# Altium footprint library PCB_IntegratedCircuit.PcbLib: 82 footprints (part 2 of 6)
Each footprint in its own frame and in the unit in brackets; x right, y up, seen from the top. Pads: shape width x height; smd on the part's side, far side on the other; paste and mask are expansions set on the pad; w line width, h text height; cw(c..) or ccw(c..) is an arc to the next point about the centre after c.
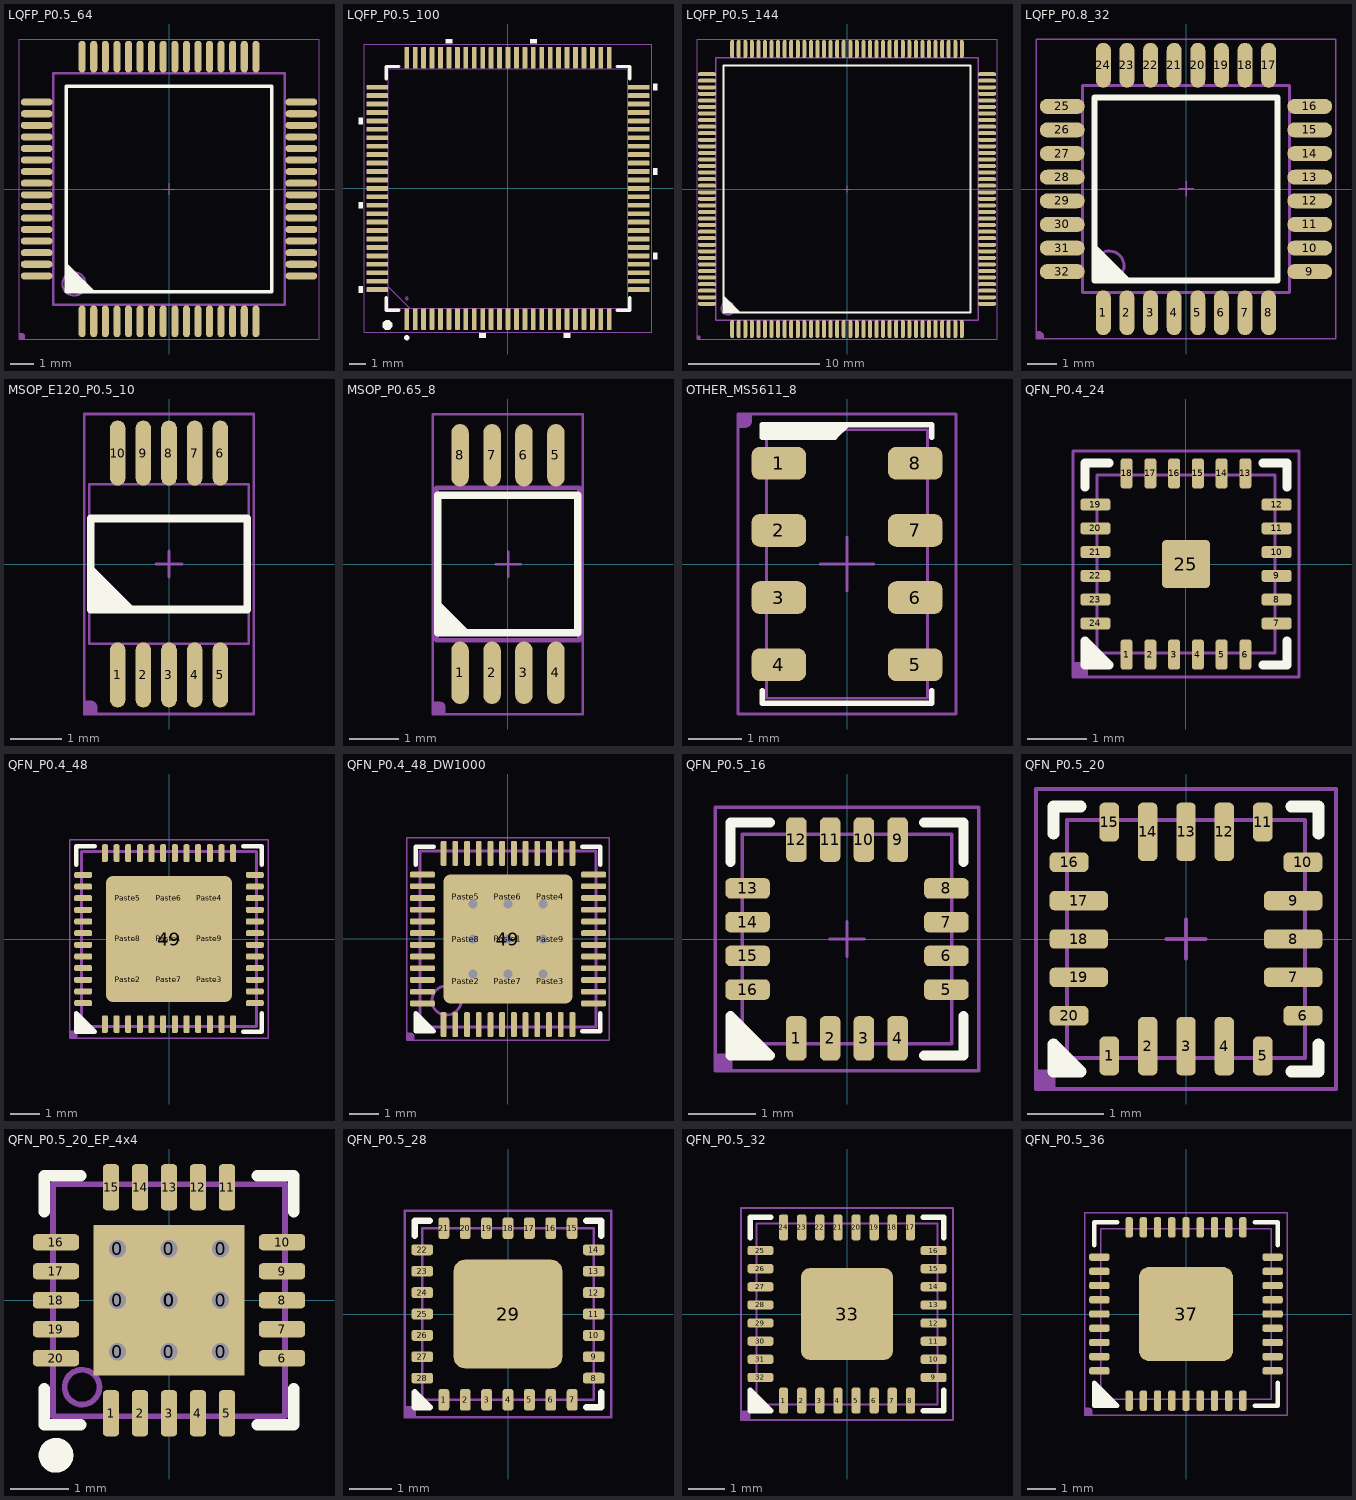
[diagram p1: the footprints below, top view; thin cyan lines are the x and y axes]

## LQFP_P0.5_64 [mil]
height 47.24
pads (64):
  oval 12x54 smd: 1(-147.64,-225) 2(-127.95,-225) 3(-108.27,-225) 4(-88.58,-225) 5(-68.9,-225) 6(-49.21,-225) 7(-29.53,-225) 8(-9.84,-225) 9(9.84,-225) 10(29.53,-225) 11(49.21,-225) 12(68.9,-225) 13(88.58,-225) 14(108.27,-225) 15(127.95,-225) 16(147.64,-225) 33(147.64,225) 34(127.95,225) 35(108.27,225) 36(88.58,225) 37(68.9,225) 38(49.21,225) 39(29.53,225) 40(9.84,225) 41(-9.84,225) 42(-29.53,225) 43(-49.21,225) 44(-68.9,225) 45(-88.58,225) 46(-108.27,225) 47(-127.95,225) 48(-147.64,225)
  oval 54x12 smd: 17(225,-147.64) 18(225,-127.95) 19(225,-108.27) 20(225,-88.58) 21(225,-68.9) 22(225,-49.21) 23(225,-29.53) 24(225,-9.84) 25(225,9.84) 26(225,29.53) 27(225,49.21) 28(225,68.9) 29(225,88.58) 30(225,108.27) 31(225,127.95) 32(225,147.64) 49(-225,147.64) 50(-225,127.95) 51(-225,108.27) 52(-225,88.58) 53(-225,68.9) 54(-225,49.21) 55(-225,29.53) 56(-225,9.84) 57(-225,-9.84) 58(-225,-29.53) 59(-225,-49.21) 60(-225,-68.9) 61(-225,-88.58) 62(-225,-108.27) 63(-225,-127.95) 64(-225,-147.64)
Top Overlay:
  region: -175,-175 -175,-125 -125,-175
  lines w6: -175,-175 -175,175 175,175 175,-175 -175,-175
Mechanical 13:
  circle w3.94: c-161.42,-161.42 r19.68
  lines w2: -10,0 10,0 ; 0,-10 0,10
  lines w3.94: -196.85,-196.85 -196.85,196.85 196.85,196.85 196.85,-196.85 -196.85,-196.85
T-Component:
  region: -255,-255 -255,-245 -250,-245 -249.01,-245 -247.17,-245.76 -245.76,-247.17 -245,-249.01 -245,-250 -245,-255
  lines w2: -255,-255 -255,255 255,255 255,-255 -255,-255
3D body "User Library-lqpf64.STEP": height 59.06, standoff 0.79, extent -236.22,-236.21 236.22,236.23

## LQFP_P0.5_100 [mm]
height 1.6
pads (100):
  rrect25% 0.284x1.27 smd paste+0 mask+0.051: 1(-6,-7.75) 2(-5.5,-7.75) 3(-5,-7.75) 4(-4.5,-7.75) 5(-4,-7.75) 6(-3.5,-7.75) 7(-3,-7.75) 8(-2.5,-7.75) 9(-2,-7.75) 10(-1.5,-7.75) 11(-1,-7.75) 12(-0.5,-7.75) 13(0,-7.75) 14(0.5,-7.75) 15(1,-7.75) 16(1.5,-7.75) 17(2,-7.75) 18(2.5,-7.75) 19(3,-7.75) 20(3.5,-7.75) 21(4,-7.75) 22(4.5,-7.75) 23(5,-7.75) 24(5.5,-7.75) 25(6,-7.75) 51(6,7.75) 52(5.5,7.75) 53(5,7.75) 54(4.5,7.75) 55(4,7.75) 56(3.5,7.75) 57(3,7.75) 58(2.5,7.75) 59(2,7.75) 60(1.5,7.75) 61(1,7.75) 62(0.5,7.75) 63(0,7.75) 64(-0.5,7.75) 65(-1,7.75) 66(-1.5,7.75) 67(-2,7.75) 68(-2.5,7.75) 69(-3,7.75) 70(-3.5,7.75) 71(-4,7.75) 72(-4.5,7.75) 73(-5,7.75) 74(-5.5,7.75) 75(-6,7.75)
  rrect25% 1.27x0.284 smd paste+0 mask+0.051: 26(7.75,-6) 27(7.75,-5.5) 28(7.75,-5) 29(7.75,-4.5) 30(7.75,-4) 31(7.75,-3.5) 32(7.75,-3) 33(7.75,-2.5) 34(7.75,-2) 35(7.75,-1.5) 36(7.75,-1) 37(7.75,-0.5) 38(7.75,0) 39(7.75,0.5) 40(7.75,1) 41(7.75,1.5) 42(7.75,2) 43(7.75,2.5) 44(7.75,3) 45(7.75,3.5) 46(7.75,4) 47(7.75,4.5) 48(7.75,5) 49(7.75,5.5) 50(7.75,6) 76(-7.75,6) 77(-7.75,5.5) 78(-7.75,5) 79(-7.75,4.5) 80(-7.75,4) 81(-7.75,3.5) 82(-7.75,3) 83(-7.75,2.5) 84(-7.75,2) 85(-7.75,1.5) 86(-7.75,1) 87(-7.75,0.5) 88(-7.75,0) 89(-7.75,-0.5) 90(-7.75,-1) 91(-7.75,-1.5) 92(-7.75,-2) 93(-7.75,-2.5) 94(-7.75,-3) 95(-7.75,-3.5) 96(-7.75,-4) 97(-7.75,-4.5) 98(-7.75,-5) 99(-7.75,-5.5) 100(-7.75,-6)
Top Overlay:
  circle w0.152: c-6,-8.851 r0.076
  circle w0.3: c-7.15,-8.1 r0.15
  region: -8.601,-5.81 -8.601,-6.191 -8.855,-6.191 -8.855,-5.81
  region: -8.601,-0.81 -8.601,-1.191 -8.855,-1.191 -8.855,-0.81
  region: -8.601,4.19 -8.601,3.809 -8.855,3.809 -8.855,4.19
  region: -3.69,8.601 -3.69,8.855 -3.309,8.855 -3.309,8.601
  region: 1.31,8.601 1.31,8.855 1.691,8.855 1.691,8.601
  region: 8.601,6.191 8.601,5.81 8.855,5.81 8.855,6.191
  region: 8.601,1.191 8.601,0.81 8.855,0.81 8.855,1.191
  region: 8.601,-3.809 8.601,-4.19 8.855,-4.19 8.855,-3.809
  region: 3.31,-8.601 3.31,-8.855 3.691,-8.855 3.691,-8.601
  region: -1.69,-8.601 -1.69,-8.855 -1.309,-8.855 -1.309,-8.601
  lines w0.203: -7.226,-6.485 -7.226,-7.226 -6.485,-7.226 ; -7.226,6.485 -7.226,7.226 -6.485,7.226 ; 6.485,-7.226 7.226,-7.226 7.226,-6.485 ; 6.485,7.226 7.226,7.226 7.226,6.485
Mechanical 13:
  circle w0: c-6,-6.518 r0.076
  lines w0.025: -7.099,-5.829 -5.829,-7.099 ; -7.099,-7.099 7.099,-7.099 7.099,7.099 -7.099,7.099 -7.099,-7.099
T-Component:
  lines w0.051: -8.534,-8.534 -8.534,8.534 -6.02,8.534 8.534,8.534 8.534,-8.534 -8.534,-8.534
3D body "LQFP100-14x14mm.step": height 1.6, standoff 0, extent -7.997,-7.997 7.997,7.997

## LQFP_P0.5_144 [mil]
height 62.99
pads (144):
  oval 12x54 smd: 1(-344.49,-420) 2(-324.8,-420) 3(-305.12,-420) 4(-285.43,-420) 5(-265.75,-420) 6(-246.06,-420) 7(-226.38,-420) 8(-206.69,-420) 9(-187.01,-420) 10(-167.32,-420) 11(-147.64,-420) 12(-127.95,-420) 13(-108.27,-420) 14(-88.58,-420) 15(-68.9,-420) 16(-49.21,-420) 17(-29.53,-420) 18(-9.84,-420) 19(9.84,-420) 20(29.53,-420) 21(49.21,-420) 22(68.9,-420) 23(88.58,-420) 24(108.27,-420) 25(127.95,-420) 26(147.64,-420) 27(167.32,-420) 28(187.01,-420) 29(206.69,-420) 30(226.38,-420) 31(246.06,-420) 32(265.75,-420) 33(285.43,-420) 34(305.12,-420) 35(324.8,-420) 36(344.49,-420) 73(344.49,420) 74(324.8,420) 75(305.12,420) 76(285.43,420) 77(265.75,420) 78(246.06,420) 79(226.38,420) 80(206.69,420) 81(187.01,420) 82(167.32,420) 83(147.64,420) 84(127.95,420) 85(108.27,420) 86(88.58,420) 87(68.9,420) 88(49.21,420) 89(29.53,420) 90(9.84,420) 91(-9.84,420) 92(-29.53,420) 93(-49.21,420) 94(-68.9,420) 95(-88.58,420) 96(-108.27,420) 97(-127.95,420) 98(-147.64,420) 99(-167.32,420) 100(-187.01,420) 101(-206.69,420) 102(-226.38,420) 103(-246.06,420) 104(-265.75,420) 105(-285.43,420) 106(-305.12,420) 107(-324.8,420) 108(-344.49,420)
  oval 54x12 smd: 37(420,-344.49) 38(420,-324.8) 39(420,-305.12) 40(420,-285.43) 41(420,-265.75) 42(420,-246.06) 43(420,-226.38) 44(420,-206.69) 45(420,-187.01) 46(420,-167.32) 47(420,-147.64) 48(420,-127.95) 49(420,-108.27) 50(420,-88.58) 51(420,-68.9) 52(420,-49.21) 53(420,-29.53) 54(420,-9.84) 55(420,9.84) 56(420,29.53) 57(420,49.21) 58(420,68.9) 59(420,88.58) 60(420,108.27) 61(420,127.95) 62(420,147.64) 63(420,167.32) 64(420,187.01) 65(420,206.69) 66(420,226.38) 67(420,246.06) 68(420,265.75) 69(420,285.43) 70(420,305.12) 71(420,324.8) 72(420,344.49) 109(-420,344.49) 110(-420,324.8) 111(-420,305.12) 112(-420,285.43) 113(-420,265.75) 114(-420,246.06) 115(-420,226.38) 116(-420,206.69) 117(-420,187.01) 118(-420,167.32) 119(-420,147.64) 120(-420,127.95) 121(-420,108.27) 122(-420,88.58) 123(-420,68.9) 124(-420,49.21) 125(-420,29.53) 126(-420,9.84) 127(-420,-9.84) 128(-420,-29.53) 129(-420,-49.21) 130(-420,-68.9) 131(-420,-88.58) 132(-420,-108.27) 133(-420,-127.95) 134(-420,-147.64) 135(-420,-167.32) 136(-420,-187.01) 137(-420,-206.69) 138(-420,-226.38) 139(-420,-246.06) 140(-420,-265.75) 141(-420,-285.43) 142(-420,-305.12) 143(-420,-324.8) 144(-420,-344.49)
Top Overlay:
  region: -370,-370 -370,-320 -320,-370
  lines w6: -370,-370 -370,370 370,370 370,-370 -370,-370
Mechanical 13:
  circle w4: c-358.27,-358.27 r19.68
  lines w2: -10,0 10,0 ; 0,-10 0,10
  lines w4: -393.7,-393.7 -393.7,393.7 393.7,393.7 393.7,-393.7 -393.7,-393.7
T-Component:
  region: -450,-450 -450,-440 -445,-440 -444.01,-440 -442.17,-440.76 -440.76,-442.17 -440,-444.01 -440,-445 -440,-450
  lines w2: -450,-450 -450,450 450,450 450,-450 -450,-450
3D body "User Library-LQFP144.STEP": height 62.99, standoff 0, extent -433.08,-433.07 433.07,433.08

## LQFP_P0.8_32 [mil]
height 47.24
pads (32):
  oval 20x60 smd: 1(-110.24,-165) 2(-78.74,-165) 3(-47.24,-165) 4(-15.75,-165) 5(15.75,-165) 6(47.24,-165) 7(78.74,-165) 8(110.24,-165) 17(110.24,165) 18(78.74,165) 19(47.24,165) 20(15.75,165) 21(-15.75,165) 22(-47.24,165) 23(-78.74,165) 24(-110.24,165)
  oval 60x20 smd: 9(165,-110.24) 10(165,-78.74) 11(165,-47.24) 12(165,-15.75) 13(165,15.75) 14(165,47.24) 15(165,78.74) 16(165,110.24) 25(-165,110.24) 26(-165,78.74) 27(-165,47.24) 28(-165,15.75) 29(-165,-15.75) 30(-165,-47.24) 31(-165,-78.74) 32(-165,-110.24)
Top Overlay:
  region: -122.05,-122.05 -122.05,-72.05 -72.05,-122.05
  lines w7.87: -122.05,-122.05 122.05,-122.05 122.05,122.05 -122.05,122.05 -122.05,-122.05
Mechanical 13:
  circle w3.94: c-102.36,-102.36 r19.68
  lines w2: -10,0 10,0 ; 0,-10 0,10
  lines w3.94: -137.8,-137.8 137.8,-137.8 137.8,137.8 -137.8,137.8 -137.8,-137.8
T-Component:
  region: -200,-200 -200,-190 -195,-190 -194.01,-190 -192.17,-190.76 -190.76,-192.17 -190,-194.01 -190,-195 -190,-200
  lines w2: -200,-200 200,-200 200,200 -200,200 -200,-200
3D body "User Library-LQFP32-0_8.STEP": height 63.46, standoff -2.02, extent -177.93,-177.92 177.92,177.93

## MSOP_E120_P0.5_10 [mil]
height 43.31
pads (10):
  oval 12x50 smd: 1(-39.37,-85) 2(-19.69,-85) 3(0,-85) 4(19.68,-85) 5(39.37,-85) 6(39.37,85) 7(19.68,85) 8(0,85) 9(-19.69,85) 10(-39.37,85)
Top Overlay:
  region: -60,-35 -60,0 -25,-35
  lines w6: -60,-35 60,-35 60,35 -60,35 -60,-35
Mechanical 13:
  lines w2: -10,0 10,0 ; 0,-10 0,10 ; -61.02,-61.02 -61.02,61.02 61.02,61.02 61.02,-61.02 -61.02,-61.02
T-Component:
  region: -65,-115 -65,-105 -60,-105 -59.01,-105 -57.17,-105.76 -55.76,-107.17 -55,-109.01 -55,-110 -55,-115
  lines w2: -65,-115 65,-115 65,115 -65,115 -65,-115
3D body "User Library-msop-10.STEP": height 45.28, standoff 0, extent -59.06,-96.45 59.05,96.46

## MSOP_P0.65_8 [mil]
pads (8):
  oval 14x50 smd: 1(-38.39,-87) 2(-12.8,-87) 3(12.8,-87) 4(38.39,-87) 5(38.39,87) 6(12.8,87) 7(-12.8,87) 8(-38.39,87)
Top Overlay:
  region: -56,-55 -56,-29 -30,-55
  lines w6: -56,-55 56,-55 56,55 -56,55 -56,-55
Mechanical 13:
  lines w2: -10,0 10,0 ; 0,-10 0,10
  lines w3.94: -57.09,-61.02 57.09,-61.02 57.09,61.02 -57.09,61.02 -57.09,-61.02
T-Component:
  region: -60,-120 -60,-110 -55,-110 -54.01,-110 -52.17,-110.76 -50.76,-112.17 -50,-114.01 -50,-115 -50,-120
  lines w2: -60,-120 -60,120 60,120 60,-120 -60,-120
3D body "TSOP65P490X110_HS-9L.step": height 43.31, standoff 0, extent -57.09,-96.06 57.09,96.06

## OTHER_MS5611_8 [mil]
height 39.37
pads (8):
  rrect50% 40x24 smd: 1(-50,73.82) 2(-50,24.61) 3(-50,-24.61) 4(-50,-73.82) 5(50,-73.82) 6(50,-24.61) 7(50,24.61) 8(50,73.82)
Top Overlay:
  region: -62,102 0,102 -9,93 -62,93
  lines w4: -62,-93 -62,-102 62,-102 62,-93 ; 0,102 -9,93 -62,93 -62,102 62,102 62,93
Mechanical 13:
  lines w2: -19.68,0 19.68,0 ; 0,-19.68 0,19.68 ; -59.06,-98.43 -59.06,98.43 59.06,98.43 59.06,-98.43 -59.06,-98.43
T-Component:
  region: -80,110 -70,110 -70,105 -70,104.01 -70.76,102.17 -72.17,100.76 -74.01,100 -75,100 -80,100
  lines w2: -80,-110 80,-110 80,110 -80,110 -80,-110
3D body "User Library-CRYSTALSMD5X32.STEP": height 39.37, standoff 0, extent -62.99,-98.43 63,98.43

## QFN_P0.4_24 [mil]
height 39.37
pads (25):
  rrect50% 8x20 smd: 1(-39.37,-60) 2(-23.62,-60) 3(-7.87,-60) 4(7.87,-60) 5(23.62,-60) 6(39.37,-60) 13(39.37,60) 14(23.62,60) 15(7.87,60) 16(-7.87,60) 17(-23.62,60) 18(-39.37,60)
  rrect50% 20x8 smd: 7(60,-39.37) 8(60,-23.62) 9(60,-7.87) 10(60,7.87) 11(60,23.62) 12(60,39.37) 19(-60,39.37) 20(-60,23.62) 21(-60,7.87) 22(-60,-7.87) 23(-60,-23.62) 24(-60,-39.37)
  rrect20% 32x32 smd: 25(0,0)
Top Overlay:
  region: -67,-67 -67,-51 -51,-67
  lines w6: -67,51 -67,67 -51,67 ; 51,-67 67,-67 67,-51 ; 51,67 67,67 67,51 ; -67,-67 -67,-51 -51,-67 -67,-67
Top Solder:
  rectangle: -39.37,-70 39.37,-50
  region: -50,-39.37 -50,39.37 -70,39.37 -70,-39.37
  rectangle: -39.37,50 39.37,70
  region: 70,-39.37 70,39.37 50,39.37 50,-39.37
Mechanical 13:
  lines w2: -10,0 10,0 ; 0,-10 0,10 ; -59.06,-59.05 59.06,-59.05 59.06,59.06 -59.06,59.06 -59.06,-59.05
T-Component:
  region: -75,-75 -75,-65 -70,-65 -69.01,-65 -67.17,-65.76 -65.76,-67.17 -65,-69.01 -65,-70 -65,-75
  lines w2: -75,-75 75,-75 75,75 -75,75 -75,-75
3D body "QFN40P300X300X100-24L.step": height 39.37, standoff 0, extent -59.85,-59.84 59.84,59.85

## QFN_P0.4_48 [mil]
height 35.43
pads (58):
  rrect50% 8x24 smd: 1(-86.61,-115) 2(-70.87,-115) 3(-55.12,-115) 4(-39.37,-115) 5(-23.62,-115) 6(-7.87,-115) 7(7.87,-115) 8(23.62,-115) 9(39.37,-115) 10(55.12,-115) 11(70.87,-115) 12(86.61,-115) 25(86.61,116) 26(70.87,116) 27(55.12,116) 28(39.37,116) 29(23.62,116) 30(7.87,116) 31(-7.87,116) 32(-23.62,116) 33(-39.37,116) 34(-55.12,116) 35(-70.87,116) 36(-86.61,116)
  rrect50% 24x8 smd: 13(116,-86.61) 14(116,-70.87) 15(116,-55.12) 16(116,-39.37) 17(116,-23.62) 18(116,-7.87) 19(116,7.87) 20(116,23.62) 21(116,39.37) 22(116,55.12) 23(116,70.87) 24(116,86.61) 37(-116,86.61) 38(-116,70.87) 39(-116,55.12) 40(-116,39.37) 41(-116,23.62) 42(-116,7.87) 43(-116,-7.87) 44(-116,-23.62) 45(-116,-39.37) 46(-116,-55.12) 47(-116,-70.87) 48(-116,-86.61)
  rrect10% 170x170 smd paste-173.23 mask+1.97: 49(0,0)
  rrect20% 50x50 on Top Paste mask+1.97: Paste1(0,0) Paste2(-55,-55) Paste3(55,-55) Paste4(55,55) Paste5(-55,55) Paste6(0,55) Paste7(0,-55) Paste8(-55,0) Paste9(55,0)
Top Overlay:
  region: -100,-125 -125,-100 -125,-125
  region: -125,-125 -100,-125
  lines w6: -125,100 -125,125 -100,125 ; 100,-125 125,-125 125,-100 ; 100,125 125,125 125,100 ; -125,-125 -100,-125 -125,-100 -125,-125
Top Solder:
  region: -104,-86.61 -104,86.61 -128,86.61 -128,-86.61
  region: 86.61,-103 -86.61,-103 -86.61,-127 86.61,-127
  region: 104,86.61 104,-86.61 128,-86.61 128,86.61
  rectangle: -86.61,104 86.61,128
Mechanical 13:
  lines w2: -10,0 10,0 ; 0,-10 0,10
  lines w3.94: -118,-118 118,-118 118,118 -118,118 -118,-118
T-Component:
  region: -134,-134 -134,-124 -129,-124 -128.01,-124 -126.17,-124.76 -124.76,-126.17 -124,-128.01 -124,-129 -124,-134
  lines w2: -134,-134 134,-134 134,134 -134,134 -134,-134
3D body "QFN40P600X600X90_HS-49N.step": height 35.43, standoff -0.04, extent -118.15,-118.15 118.15,118.15

## QFN_P0.4_48_DW1000 [mm]
height 0.9
pads (58):
  rrect50% 0.2x0.85 smd mask+0.05: 1(-2.2,-2.925) 2(-1.8,-2.925) 3(-1.4,-2.925) 4(-1,-2.925) 5(-0.6,-2.925) 6(-0.2,-2.925) 7(0.2,-2.925) 8(0.6,-2.925) 9(1,-2.925) 10(1.4,-2.925) 11(1.8,-2.925) 12(2.2,-2.925) 25(2.2,2.925) 26(1.8,2.925) 27(1.4,2.925) 28(1,2.925) 29(0.6,2.925) 30(0.2,2.925) 31(-0.2,2.925) 32(-0.6,2.925) 33(-1,2.925) 34(-1.4,2.925) 35(-1.8,2.925) 36(-2.2,2.925)
  rrect50% 0.85x0.2 smd mask+0.05: 13(2.925,-2.2) 14(2.925,-1.8) 15(2.925,-1.4) 16(2.925,-1) 17(2.925,-0.6) 18(2.925,-0.2) 19(2.925,0.2) 20(2.925,0.6) 21(2.925,1) 22(2.925,1.4) 23(2.925,1.8) 24(2.925,2.2) 37(-2.925,2.2) 38(-2.925,1.8) 39(-2.925,1.4) 40(-2.925,1) 41(-2.925,0.6) 42(-2.925,0.2) 43(-2.925,-0.2) 44(-2.925,-0.6) 45(-2.925,-1) 46(-2.925,-1.4) 47(-2.925,-1.8) 48(-2.925,-2.2)
  rrect10% 4.4x4.4 smd paste-4.4 mask+0.05: 49(0,0)
  rrect20% 1.3x1.3 on Top Paste mask+0.05: Paste1(0,0) Paste2(-1.45,-1.45) Paste3(1.45,-1.45) Paste4(1.45,1.45) Paste5(-1.45,1.45) Paste6(0,1.45) Paste7(0,-1.45) Paste8(-1.45,0) Paste9(1.45,0)
via 0,1.2 diameter 0.6 hole 0.3
via -1.2,1.2 diameter 0.6 hole 0.3
via -1.2,-1.2 diameter 0.6 hole 0.3
via 1.2,1.2 diameter 0.6 hole 0.3
via 1.2,0 diameter 0.6 hole 0.3
via 1.2,-1.2 diameter 0.6 hole 0.3
via 0,-1.2 diameter 0.6 hole 0.3
via 0,0 diameter 0.6 hole 0.3
via -1.2,0 diameter 0.6 hole 0.3
Top Overlay:
  region: -3.15,-3.15 -3.15,-2.54 -2.54,-3.15
  lines w0.152: -3.15,2.54 -3.15,3.15 -2.54,3.15 ; 2.54,-3.15 3.15,-3.15 3.15,-2.54 ; 2.54,3.15 3.15,3.15 3.15,2.54 ; -3.15,-3.15 -3.15,-2.54 -2.54,-3.15 -3.15,-3.15
Top Solder:
  region: 2.5,2.2 2.5,-2.2 3.35,-2.2 3.35,2.2
  region: 2.2,-2.5 -2.2,-2.5 -2.2,-3.35 2.2,-3.35
  region: -2.5,-2.2 -2.5,2.2 -3.35,2.2 -3.35,-2.2
  rectangle: -2.2,2.5 2.2,3.35
Mechanical 13:
  circle w0.1: c-2.1,-2.1 r0.5
  lines w0.051: -0.254,0 0.254,0 ; 0,-0.254 0,0.254
  lines w0.1: -3,-3 -3,3 3,3 3,-3 -3,-3
T-Component:
  region: -3.454,-3.454 -3.454,-3.2 -3.327,-3.2 -3.302,-3.2 -3.255,-3.22 -3.22,-3.255 -3.2,-3.302 -3.2,-3.327 -3.2,-3.454
  lines w0.051: -3.454,-3.454 3.454,-3.454 3.454,3.454 -3.454,3.454 -3.454,-3.454
3D body "QFN40P600X600X90_HS-49L.step": height 0.9, standoff 0, extent -3.001,-3.001 3.001,3.001

## QFN_P0.5_16 [mil]
height 23.62
pads (16):
  rrect50% 12x26 smd: 1(-29.53,-58) 2(-9.84,-58) 3(9.84,-58) 4(29.53,-58) 9(29.53,58) 10(9.84,58) 11(-9.84,58) 12(-29.53,58)
  rrect50% 26x12 smd: 5(58,-29.53) 6(58,-9.84) 7(58,9.84) 8(58,29.53) 13(-58,29.53) 14(-58,9.84) 15(-58,-9.84) 16(-58,-29.53)
Top Overlay:
  region: -45,-68 -68,-68 -68,-45
  lines w6: -68,45 -68,68 -45,68 ; 45,-68 68,-68 68,-45 ; 45,68 68,68 68,45 ; -68,-68 -68,-45 -45,-68 -68,-68
Top Solder:
  region: -29.53,71 -29.53,45 29.53,45 29.53,71
  rectangle: -71,-29.53 -45,29.53
  region: 29.53,-71 29.53,-45 -29.53,-45 -29.53,-71
  region: 71,29.53 45,29.53 45,-29.53 71,-29.53
Mechanical 13:
  lines w2: -10,0 10,0 ; 0,-10 0,10 ; -61.02,-61.02 -61.02,61.02 61.02,61.02 61.02,-61.02 -61.02,-61.02
T-Component:
  region: -77,-77 -77,-67 -72,-67 -71.01,-67 -69.17,-67.76 -67.76,-69.17 -67,-71.01 -67,-72 -67,-77
  lines w2: -77,-77 77,-77 77,77 -77,77 -77,-77
3D body "QFN50P300X300X100-16N.step": height 39.37, standoff 0, extent -59.06,-59.05 59.05,59.06

## QFN_P0.5_20 [mil] "QFN, 20-Leads, Body 3.00x3.00mm, Pitch 0.50mm, IPC High Density"
height 23.62
pads (20):
  rrect50% 10x20 smd: 1(-39.37,-60) 5(39.37,-60) 11(39.37,60) 15(-39.37,60)
  rrect50% 10x30 smd: 2(-19.69,-55) 3(0,-55) 4(19.68,-55) 12(19.68,55) 13(0,55) 14(-19.69,55)
  rrect50% 20x10 smd: 6(60,-39.37) 10(60,39.37) 16(-60,39.37) 20(-60,-39.37)
  rrect50% 30x10 smd: 7(55,-19.69) 8(55,0) 9(55,19.68) 17(-55,19.68) 18(-55,0) 19(-55,-19.69)
Top Overlay:
  region: -54,-68 -68,-68 -68,-54
  lines w6: -68,54 -68,68 -54,68 ; 54,-68 68,-68 68,-54 ; 54,68 68,68 68,54 ; -68,-68 -54,-68 -68,-54 -68,-68
Top Solder:
  rectangle: 40,-19.68 70,19.69
  rectangle: -70,-19.69 -40,19.69
  region: 19.69,40 19.69,70 -19.69,70 -19.69,40
  region: 19.69,-70 19.69,-40 -19.69,-40 -19.69,-70
  region: 19.69,50 39.37,50 39.37,70 19.68,70
  region: -19.69,-50 -39.37,-50 -39.37,-70 -19.69,-70
  region: 70,19.69 70,39.37 50,39.37 50,19.68
  region: -70,-19.69 -70,-39.37 -50,-39.37 -50,-19.69
  region: -19.69,70 -39.37,70 -39.37,50 -19.69,50
  region: -50,19.69 -50,39.37 -70,39.37 -70,19.68
  region: 19.69,-70 39.37,-70 39.37,-50 19.68,-50
  region: 50,-19.69 50,-39.37 70,-39.37 70,-19.69
Mechanical 13:
  lines w2: -10,0 10,0 ; 0,-10 0,10 ; -61.02,-61.02 61.02,-61.02 61.02,61.02 -61.02,61.02 -61.02,-61.02
T-Component:
  region: -77,-77 -77,-67 -72,-67 -71.01,-67 -69.17,-67.76 -67.76,-69.17 -67,-71.01 -67,-72 -67,-77
  lines w2: -77,-77 77,-77 77,77 -77,77 -77,-77
3D body "QFN50P300X300X60-20L.step": height 23.62, standoff 0, extent -61.06,-61.06 61.06,61.06

## QFN_P0.5_20_EP_4x4 [mm]
pads (30):
  round 0.4 hole 0.3: 0(-0.889,-0.889) 0(-0.889,0) 0(-0.889,0.889) 0(0,-0.889) 0(0,0.889) 0(0,0) 0(0.889,-0.889) 0(0.889,0) 0(0.889,0.889)
  rect 2.6x2.6 smd mask+0.051: 0(0,0)
  rrect50% 0.28x0.8 smd mask+0.051: 1(-1,-1.95) 2(-0.5,-1.95) 3(0,-1.95) 4(0.5,-1.95) 5(1,-1.95) 11(1,1.95) 12(0.5,1.95) 13(0,1.95) 14(-0.5,1.95) 15(-1,1.95)
  rrect50% 0.8x0.28 smd mask+0.051: 6(1.95,-1) 7(1.95,-0.5) 8(1.95,0) 9(1.95,0.5) 10(1.95,1) 16(-1.95,1) 17(-1.95,0.5) 18(-1.95,0) 19(-1.95,-0.5) 20(-1.95,-1)
Top Overlay:
  circle w0.3: c-1.95,-2.675 r0.15
  lines w0.2: -2.15,-1.525 -2.15,-2.15 -1.525,-2.15 ; -2.15,1.525 -2.15,2.15 -1.525,2.15 ; 1.525,-2.15 2.15,-2.15 2.15,-1.525 ; 1.525,2.15 2.15,2.15 2.15,1.525
Mechanical 13:
  circle w0.1: c-1.5,-1.5 r0.3
  lines w0.1: -2,-2 2,-2 2,2 -2,2 -2,-2
3D body "User Library-qfn20-4x4.step": height 0.92, standoff 0, extent -2,-2 2,2

## QFN_P0.5_28 [mil]
height 23.62
pads (29):
  rrect50% 10x20 smd: 1(-59.06,-79) 2(-39.37,-79) 3(-19.68,-79) 4(0,-79) 5(19.68,-79) 6(39.37,-79) 7(59.06,-79) 15(59.06,79) 16(39.37,79) 17(19.68,79) 18(0,79) 19(-19.68,79) 20(-39.37,79) 21(-59.06,79)
  rrect50% 20x10 smd: 8(79,-59.06) 9(79,-39.37) 10(79,-19.68) 11(79,0) 12(79,19.68) 13(79,39.37) 14(79,59.06) 22(-79,59.06) 23(-79,39.37) 24(-79,19.68) 25(-79,0) 26(-79,-19.68) 27(-79,-39.37)
  rrect50% 20x9.84 smd: 28(-79,-59.06)
  rrect20% 100x100 smd: 29(0,0)
Top Overlay:
  region: -72,-86 -86,-72 -86,-86
  lines w6: -86,72 -86,86 -72,86 ; 72,-86 86,-86 86,-72 ; 72,86 86,86 86,72 ; -86,-86 -86,-72 -72,-86 -86,-86
Top Solder:
  rectangle: -89,-59.06 -69,59.06
  region: -59.06,89 -59.06,69 59.06,69 59.06,89
  region: 89,59.06 69,59.06 69,-59.06 89,-59.06
  region: 59.06,-89 59.06,-69 -59.05,-69 -59.06,-89
Mechanical 13:
  lines w2: -10,0 10,0 ; 0,-10 0,10 ; -79,-79 79,-79 79,79 -79,79 -79,-79
T-Component:
  region: -95,-95 -95,-85 -90,-85 -89.01,-85 -87.17,-85.76 -85.76,-87.17 -85,-89.01 -85,-90 -85,-95
  lines w2: -95,-95 -95,95 95,95 95,-95 -95,-95
3D body "QFN50P400X400X55-28L.step": height 21.65, standoff 0, extent -78.78,-78.78 78.78,78.78

## QFN_P0.5_32 [mil]
height 39.37
pads (33):
  rrect50% 10x28 smd: 1(-68.9,-94) 2(-49.21,-94) 3(-29.53,-94) 4(-9.84,-94) 5(9.84,-94) 6(29.53,-94) 7(49.21,-94) 8(68.9,-94) 17(68.9,94) 18(49.21,94) 19(29.53,94) 20(9.84,94) 21(-9.84,94) 22(-29.53,94) 23(-49.21,94) 24(-68.9,94)
  rrect50% 28x10 smd: 9(94,-68.9) 10(94,-49.21) 11(94,-29.53) 12(94,-9.84) 13(94,9.84) 14(94,29.53) 15(94,49.21) 16(94,68.9) 25(-94,68.9) 26(-94,49.21) 27(-94,29.53) 28(-94,9.84) 29(-94,-9.84) 30(-94,-29.53) 31(-94,-49.21) 32(-94,-68.9)
  rrect20% 100x100 smd: 33(0,0)
Top Overlay:
  region: -105,-83 -105,-105 -83,-105
  lines w6: -105,83 -105,105 -83,105 ; 83,-105 105,-105 105,-83 ; 83,105 105,105 105,83 ; -105,-105 -105,-83 -83,-105 -105,-105
Top Solder:
  region: -68.9,108 -68.9,80 68.9,80 68.9,108
  region: -68.9,-80 -68.9,-108 68.9,-108 68.9,-80
  region: 108,68.9 80,68.9 80,-68.9 108,-68.9
  region: -80,68.9 -108,68.9 -108,-68.9 -80,-68.9
Mechanical 13:
  lines w2: -10,0 10,0 ; 0,-10 0,10 ; -98.43,-98.42 98.42,-98.42 98.42,98.43 -98.43,98.43 -98.43,-98.42
T-Component:
  region: -115,-115 -115,-105 -110,-105 -109.01,-105 -107.17,-105.76 -105.76,-107.17 -105,-109.01 -105,-110 -105,-115
  lines w2: -115,-115 -115,115 115,115 115,-115 -115,-115
3D body "QFN50P500X500X55-32L.step": height 21.65, standoff 0, extent -99.22,-99.21 99.21,99.22

## QFN_P0.5_36 [mil]
height 39.37
pads (37):
  rrect50% 10x28 smd: 1(-78.74,-120) 2(-59.06,-120) 3(-39.37,-120) 4(-19.69,-120) 5(0,-120) 6(19.68,-120) 7(39.37,-120) 8(59.05,-120) 9(78.74,-120) 19(78.74,120) 20(59.05,120) 21(39.37,120) 22(19.68,120) 23(0,120) 24(-19.68,120) 25(-39.37,120) 26(-59.06,120) 27(-78.74,120)
  rrect50% 28x10 smd: 10(120,-78.74) 11(120,-59.06) 12(120,-39.37) 13(120,-19.69) 14(120,0) 15(120,19.68) 16(120,39.37) 17(120,59.05) 18(120,78.74) 28(-120,78.74) 29(-120,59.05) 30(-120,39.37) 31(-120,19.68) 32(-120,0) 33(-120,-19.69) 34(-120,-39.37) 35(-120,-59.06) 36(-120,-78.74)
  rrect20% 130x130 smd: 37(0,0)
Top Overlay:
  region: -127,-127 -127,-95 -95,-127
  lines w6: -127,95 -127,127 -95,127 ; 95,-127 127,-127 127,-95 ; 95,127 127,127 127,95 ; -127,-127 -127,-95 -95,-127 -127,-127
Top Solder:
  region: 87.74,-134 87.74,-106 -87.74,-106 -87.74,-134
  region: 87.74,106 87.74,134 -87.74,134 -87.74,106
  region: 134,87.74 106,87.74 106,-87.74 134,-87.74
  region: -106,87.74 -134,87.74 -134,-87.74 -106,-87.74
Mechanical 13:
  lines w2: -10,0 10,0 ; 0,-10 0,10 ; -118.11,-118.11 118.11,-118.11 118.11,118.11 -118.11,118.11 -118.11,-118.11
T-Component:
  region: -140,-140 -140,-130 -135,-130 -134.01,-130 -132.17,-130.76 -130.76,-132.17 -130,-134.01 -130,-135 -130,-140
  lines w2: -140,-140 -140,140 140,140 140,-140 -140,-140
3D body "QFN50P600X600X90-36L.step": height 35.43, standoff 0, extent -118.9,-118.89 118.89,118.9